# Altium integrated library Weidmueller_OMNIMATE_Signal.IntLib: 2550 symbols (part 12 of 45) (continued)
## 1571140000_Single (continued)
OMNIMATE Signal - series BL/SL 5.00; PartNumber: 1571140000; Manufacturer: Weidmueller; Short_text_for_material: SL 5.00/03/90 3.2SN OR BX; Side_termination_characteristic: open side; Mounting_onto_the_PCB: Solder connection; Pitch_mm: 5 mm; Pitch_inch: 0.197 inch; No_of_poles: 3; Outgoing_elbow: 90°; Solder_pin_length_mm: 3.2 mm; Contact_material: CuSn; Contact_surface: tinned; Insulating_material: PBT; UL_94_flammability_rating: V-0; Rated_voltage_for_surge_voltage_class_pollution_degree_II_2: 400 V; Rated_current_min_no_of_poles_TU_20_deg_C: 32 A; Rated_voltage_use_group_B_UL_1059: 300 V; Rated_current_use_group_B_UL_1059: 15 A; PackageReference: SL_5_00_90_03; Colour: Orange; Packaging: Box; Qty: 100 PCS; Revision: V1; ComponentLink1Description: Manufacturer URL; ComponentLink1URL: http://www.weidmueller.com/; ComponentLink2Description: URL Link1; ComponentLink2URL: http://catalog.weidmueller.com/catalog/Start.do?localeId=en&ObjectID=1571140000
footprint SL_5_00_90_03 (OMNIMATE Signal - Serie BL/SL 5.00  SL 5.00/03/90 3.2)
part A pins: A1
part B pins: A2
part C pins: A3

## 1571150000
designator J?
OMNIMATE Signal - series BL/SL 5.00; PartNumber: 1571150000; Manufacturer: Weidmueller; Short_text_for_material: SL 5.00/04/90 3.2SN OR BX; Side_termination_characteristic: open side; Mounting_onto_the_PCB: Solder connection; Pitch_mm: 5 mm; Pitch_inch: 0.197 inch; No_of_poles: 4; Outgoing_elbow: 90°; Solder_pin_length_mm: 3.2 mm; Contact_material: CuSn; Contact_surface: tinned; Insulating_material: PBT; UL_94_flammability_rating: V-0; Rated_voltage_for_surge_voltage_class_pollution_degree_II_2: 400 V; Rated_current_min_no_of_poles_TU_20_deg_C: 32 A; Rated_voltage_use_group_B_UL_1059: 300 V; Rated_current_use_group_B_UL_1059: 15 A; PackageReference: SL_5_00_90_04; Colour: Orange; Packaging: Box; Qty: 100 PCS; Revision: V1; ComponentLink1Description: Manufacturer URL; ComponentLink1URL: http://www.weidmueller.com/; ComponentLink2Description: URL Link1; ComponentLink2URL: http://catalog.weidmueller.com/catalog/Start.do?localeId=en&ObjectID=1571150000
footprint SL_5_00_90_04 (OMNIMATE Signal - Serie BL/SL 5.00  SL 5.00/04/90 3.2)
pins: A1, A2, A3, A4

## 1571150000_Single
designator J?
OMNIMATE Signal - series BL/SL 5.00; PartNumber: 1571150000; Manufacturer: Weidmueller; Short_text_for_material: SL 5.00/04/90 3.2SN OR BX; Side_termination_characteristic: open side; Mounting_onto_the_PCB: Solder connection; Pitch_mm: 5 mm; Pitch_inch: 0.197 inch; No_of_poles: 4; Outgoing_elbow: 90°; Solder_pin_length_mm: 3.2 mm; Contact_material: CuSn; Contact_surface: tinned; Insulating_material: PBT; UL_94_flammability_rating: V-0; Rated_voltage_for_surge_voltage_class_pollution_degree_II_2: 400 V; Rated_current_min_no_of_poles_TU_20_deg_C: 32 A; Rated_voltage_use_group_B_UL_1059: 300 V; Rated_current_use_group_B_UL_1059: 15 A; PackageReference: SL_5_00_90_04; Colour: Orange; Packaging: Box; Qty: 100 PCS; Revision: V1; ComponentLink1Description: Manufacturer URL; ComponentLink1URL: http://www.weidmueller.com/; ComponentLink2Description: URL Link1; ComponentLink2URL: http://catalog.weidmueller.com/catalog/Start.do?localeId=en&ObjectID=1571150000
footprint SL_5_00_90_04 (OMNIMATE Signal - Serie BL/SL 5.00  SL 5.00/04/90 3.2)
part A pins: A1
part B pins: A2
part C pins: A3
part D pins: A4

## 1571190000
designator J?
OMNIMATE Signal - series BL/SL 5.00; PartNumber: 1571190000; Manufacturer: Weidmueller; Short_text_for_material: SL 5.00/08/90 3.2SN OR BX; Side_termination_characteristic: open side; Mounting_onto_the_PCB: Solder connection; Pitch_mm: 5 mm; Pitch_inch: 0.197 inch; No_of_poles: 8; Outgoing_elbow: 90°; Solder_pin_length_mm: 3.2 mm; Contact_material: CuSn; Contact_surface: tinned; Insulating_material: PBT; UL_94_flammability_rating: V-0; Rated_voltage_for_surge_voltage_class_pollution_degree_II_2: 400 V; Rated_current_min_no_of_poles_TU_20_deg_C: 32 A; Rated_voltage_use_group_B_UL_1059: 300 V; Rated_current_use_group_B_UL_1059: 15 A; PackageReference: SL_5_00_90_08; Colour: Orange; Packaging: Box; Qty: 50 PCS; Revision: V1; ComponentLink1Description: Manufacturer URL; ComponentLink1URL: http://www.weidmueller.com/; ComponentLink2Description: URL Link1; ComponentLink2URL: http://catalog.weidmueller.com/catalog/Start.do?localeId=en&ObjectID=1571190000
footprint SL_5_00_90_08 (OMNIMATE Signal - Serie BL/SL 5.00  SL 5.00/08/90 3.2)
pins: A1, A2, A3, A4, A5, A6, A7, A8

## 1571190000_Single
designator J?
OMNIMATE Signal - series BL/SL 5.00; PartNumber: 1571190000; Manufacturer: Weidmueller; Short_text_for_material: SL 5.00/08/90 3.2SN OR BX; Side_termination_characteristic: open side; Mounting_onto_the_PCB: Solder connection; Pitch_mm: 5 mm; Pitch_inch: 0.197 inch; No_of_poles: 8; Outgoing_elbow: 90°; Solder_pin_length_mm: 3.2 mm; Contact_material: CuSn; Contact_surface: tinned; Insulating_material: PBT; UL_94_flammability_rating: V-0; Rated_voltage_for_surge_voltage_class_pollution_degree_II_2: 400 V; Rated_current_min_no_of_poles_TU_20_deg_C: 32 A; Rated_voltage_use_group_B_UL_1059: 300 V; Rated_current_use_group_B_UL_1059: 15 A; PackageReference: SL_5_00_90_08; Colour: Orange; Packaging: Box; Qty: 50 PCS; Revision: V1; ComponentLink1Description: Manufacturer URL; ComponentLink1URL: http://www.weidmueller.com/; ComponentLink2Description: URL Link1; ComponentLink2URL: http://catalog.weidmueller.com/catalog/Start.do?localeId=en&ObjectID=1571190000
footprint SL_5_00_90_08 (OMNIMATE Signal - Serie BL/SL 5.00  SL 5.00/08/90 3.2)
part A pins: A1
part B pins: A2
part C pins: A3
part D pins: A4
part E pins: A5
part F pins: A6
part G pins: A7
part H pins: A8

## 1580860000
designator J?
OMNIMATE Signal - series BL/SL 5.00; PartNumber: 1580860000; Manufacturer: Weidmueller; Short_text_for_material: SL 5.00/02/90B 3.2SN OR BX; Side_termination_characteristic: Dovetails for fixing blocks; Mounting_onto_the_PCB: Solder connection; Pitch_mm: 5 mm; Pitch_inch: 0.197 inch; No_of_poles: 2; Outgoing_elbow: 90°; Solder_pin_length_mm: 3.2 mm; Contact_material: CuSn; Contact_surface: tinned; Insulating_material: PBT; UL_94_flammability_rating: V-0; Rated_voltage_for_surge_voltage_class_pollution_degree_II_2: 400 V; Rated_current_min_no_of_poles_TU_20_deg_C: 32 A; Rated_voltage_use_group_B_UL_1059: 300 V; Rated_current_use_group_B_UL_1059: 15 A; PackageReference: SL_5_00_90B_02; Colour: Orange; Packaging: Box; Qty: 100 PCS; Revision: V1; ComponentLink1Description: Manufacturer URL; ComponentLink1URL: http://www.weidmueller.com/; ComponentLink2Description: URL Link1; ComponentLink2URL: http://catalog.weidmueller.com/catalog/Start.do?localeId=en&ObjectID=1580860000
footprint SL_5_00_90B_02 (OMNIMATE Signal - Serie BL/SL 5.00  SL 5.00/02/90B 3.2)
pins: A1, A2

## 1580860000_Single
designator J?
OMNIMATE Signal - series BL/SL 5.00; PartNumber: 1580860000; Manufacturer: Weidmueller; Short_text_for_material: SL 5.00/02/90B 3.2SN OR BX; Side_termination_characteristic: Dovetails for fixing blocks; Mounting_onto_the_PCB: Solder connection; Pitch_mm: 5 mm; Pitch_inch: 0.197 inch; No_of_poles: 2; Outgoing_elbow: 90°; Solder_pin_length_mm: 3.2 mm; Contact_material: CuSn; Contact_surface: tinned; Insulating_material: PBT; UL_94_flammability_rating: V-0; Rated_voltage_for_surge_voltage_class_pollution_degree_II_2: 400 V; Rated_current_min_no_of_poles_TU_20_deg_C: 32 A; Rated_voltage_use_group_B_UL_1059: 300 V; Rated_current_use_group_B_UL_1059: 15 A; PackageReference: SL_5_00_90B_02; Colour: Orange; Packaging: Box; Qty: 100 PCS; Revision: V1; ComponentLink1Description: Manufacturer URL; ComponentLink1URL: http://www.weidmueller.com/; ComponentLink2Description: URL Link1; ComponentLink2URL: http://catalog.weidmueller.com/catalog/Start.do?localeId=en&ObjectID=1580860000
footprint SL_5_00_90B_02 (OMNIMATE Signal - Serie BL/SL 5.00  SL 5.00/02/90B 3.2)
part A pins: A1
part B pins: A2

## 1580870000
designator J?
OMNIMATE Signal - series BL/SL 5.00; PartNumber: 1580870000; Manufacturer: Weidmueller; Short_text_for_material: SL 5.00/03/90B 3.2SN OR BX; Side_termination_characteristic: Dovetails for fixing blocks; Mounting_onto_the_PCB: Solder connection; Pitch_mm: 5 mm; Pitch_inch: 0.197 inch; No_of_poles: 3; Outgoing_elbow: 90°; Solder_pin_length_mm: 3.2 mm; Contact_material: CuSn; Contact_surface: tinned; Insulating_material: PBT; UL_94_flammability_rating: V-0; Rated_voltage_for_surge_voltage_class_pollution_degree_II_2: 400 V; Rated_current_min_no_of_poles_TU_20_deg_C: 32 A; Rated_voltage_use_group_B_UL_1059: 300 V; Rated_current_use_group_B_UL_1059: 15 A; PackageReference: SL_5_00_90B_03; Colour: Orange; Packaging: Box; Qty: 100 PCS; Revision: V1; ComponentLink1Description: Manufacturer URL; ComponentLink1URL: http://www.weidmueller.com/; ComponentLink2Description: URL Link1; ComponentLink2URL: http://catalog.weidmueller.com/catalog/Start.do?localeId=en&ObjectID=1580870000
footprint SL_5_00_90B_03 (OMNIMATE Signal - Serie BL/SL 5.00  SL 5.00/03/90B 3.2)
pins: A1, A2, A3

## 1580870000_Single
designator J?
OMNIMATE Signal - series BL/SL 5.00; PartNumber: 1580870000; Manufacturer: Weidmueller; Short_text_for_material: SL 5.00/03/90B 3.2SN OR BX; Side_termination_characteristic: Dovetails for fixing blocks; Mounting_onto_the_PCB: Solder connection; Pitch_mm: 5 mm; Pitch_inch: 0.197 inch; No_of_poles: 3; Outgoing_elbow: 90°; Solder_pin_length_mm: 3.2 mm; Contact_material: CuSn; Contact_surface: tinned; Insulating_material: PBT; UL_94_flammability_rating: V-0; Rated_voltage_for_surge_voltage_class_pollution_degree_II_2: 400 V; Rated_current_min_no_of_poles_TU_20_deg_C: 32 A; Rated_voltage_use_group_B_UL_1059: 300 V; Rated_current_use_group_B_UL_1059: 15 A; PackageReference: SL_5_00_90B_03; Colour: Orange; Packaging: Box; Qty: 100 PCS; Revision: V1; ComponentLink1Description: Manufacturer URL; ComponentLink1URL: http://www.weidmueller.com/; ComponentLink2Description: URL Link1; ComponentLink2URL: http://catalog.weidmueller.com/catalog/Start.do?localeId=en&ObjectID=1580870000
footprint SL_5_00_90B_03 (OMNIMATE Signal - Serie BL/SL 5.00  SL 5.00/03/90B 3.2)
part A pins: A1
part B pins: A2
part C pins: A3

## 1580880000
designator J?
OMNIMATE Signal - series BL/SL 5.00; PartNumber: 1580880000; Manufacturer: Weidmueller; Short_text_for_material: SL 5.00/04/90B 3.2SN OR BX; Side_termination_characteristic: Dovetails for fixing blocks; Mounting_onto_the_PCB: Solder connection; Pitch_mm: 5 mm; Pitch_inch: 0.197 inch; No_of_poles: 4; Outgoing_elbow: 90°; Solder_pin_length_mm: 3.2 mm; Contact_material: CuSn; Contact_surface: tinned; Insulating_material: PBT; UL_94_flammability_rating: V-0; Rated_voltage_for_surge_voltage_class_pollution_degree_II_2: 400 V; Rated_current_min_no_of_poles_TU_20_deg_C: 32 A; Rated_voltage_use_group_B_UL_1059: 300 V; Rated_current_use_group_B_UL_1059: 15 A; PackageReference: SL_5_00_90B_04; Colour: Orange; Packaging: Box; Qty: 100 PCS; Revision: V1; ComponentLink1Description: Manufacturer URL; ComponentLink1URL: http://www.weidmueller.com/; ComponentLink2Description: URL Link1; ComponentLink2URL: http://catalog.weidmueller.com/catalog/Start.do?localeId=en&ObjectID=1580880000
footprint SL_5_00_90B_04 (OMNIMATE Signal - Serie BL/SL 5.00  SL 5.00/04/90B 3.2)
pins: A1, A2, A3, A4

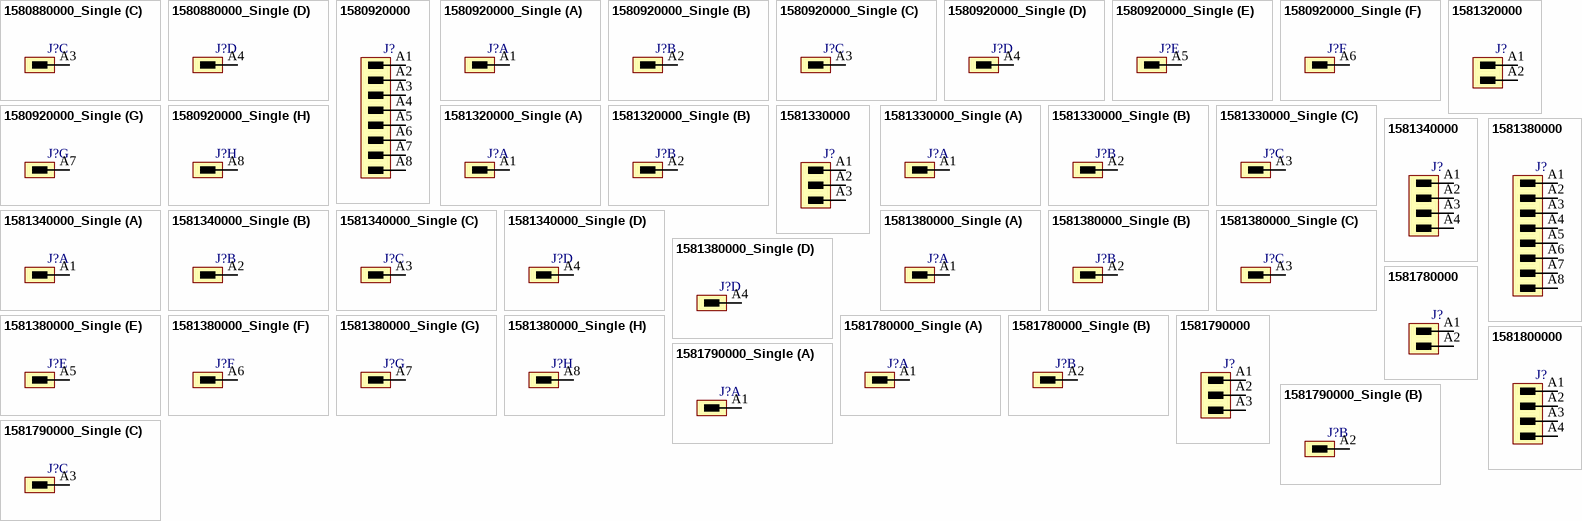
[diagram p72: symbols 1580880000_Single to 1581800000]

## 1580880000_Single
designator J?
OMNIMATE Signal - series BL/SL 5.00; PartNumber: 1580880000; Manufacturer: Weidmueller; Short_text_for_material: SL 5.00/04/90B 3.2SN OR BX; Side_termination_characteristic: Dovetails for fixing blocks; Mounting_onto_the_PCB: Solder connection; Pitch_mm: 5 mm; Pitch_inch: 0.197 inch; No_of_poles: 4; Outgoing_elbow: 90°; Solder_pin_length_mm: 3.2 mm; Contact_material: CuSn; Contact_surface: tinned; Insulating_material: PBT; UL_94_flammability_rating: V-0; Rated_voltage_for_surge_voltage_class_pollution_degree_II_2: 400 V; Rated_current_min_no_of_poles_TU_20_deg_C: 32 A; Rated_voltage_use_group_B_UL_1059: 300 V; Rated_current_use_group_B_UL_1059: 15 A; PackageReference: SL_5_00_90B_04; Colour: Orange; Packaging: Box; Qty: 100 PCS; Revision: V1; ComponentLink1Description: Manufacturer URL; ComponentLink1URL: http://www.weidmueller.com/; ComponentLink2Description: URL Link1; ComponentLink2URL: http://catalog.weidmueller.com/catalog/Start.do?localeId=en&ObjectID=1580880000
footprint SL_5_00_90B_04 (OMNIMATE Signal - Serie BL/SL 5.00  SL 5.00/04/90B 3.2)
part A pins: A1
part B pins: A2
part C pins: A3
part D pins: A4

## 1580920000
designator J?
OMNIMATE Signal - series BL/SL 5.00; PartNumber: 1580920000; Manufacturer: Weidmueller; Short_text_for_material: SL 5.00/08/90B 3.2SN OR BX; Side_termination_characteristic: Dovetails for fixing blocks; Mounting_onto_the_PCB: Solder connection; Pitch_mm: 5 mm; Pitch_inch: 0.197 inch; No_of_poles: 8; Outgoing_elbow: 90°; Solder_pin_length_mm: 3.2 mm; Contact_material: CuSn; Contact_surface: tinned; Insulating_material: PBT; UL_94_flammability_rating: V-0; Rated_voltage_for_surge_voltage_class_pollution_degree_II_2: 400 V; Rated_current_min_no_of_poles_TU_20_deg_C: 32 A; Rated_voltage_use_group_B_UL_1059: 300 V; Rated_current_use_group_B_UL_1059: 15 A; PackageReference: SL_5_00_90B_08; Colour: Orange; Packaging: Box; Qty: 50 PCS; Revision: V1; ComponentLink1Description: Manufacturer URL; ComponentLink1URL: http://www.weidmueller.com/; ComponentLink2Description: URL Link1; ComponentLink2URL: http://catalog.weidmueller.com/catalog/Start.do?localeId=en&ObjectID=1580920000
footprint SL_5_00_90B_08 (OMNIMATE Signal - Serie BL/SL 5.00  SL 5.00/08/90B 3.2)
pins: A1, A2, A3, A4, A5, A6, A7, A8

## 1580920000_Single
designator J?
OMNIMATE Signal - series BL/SL 5.00; PartNumber: 1580920000; Manufacturer: Weidmueller; Short_text_for_material: SL 5.00/08/90B 3.2SN OR BX; Side_termination_characteristic: Dovetails for fixing blocks; Mounting_onto_the_PCB: Solder connection; Pitch_mm: 5 mm; Pitch_inch: 0.197 inch; No_of_poles: 8; Outgoing_elbow: 90°; Solder_pin_length_mm: 3.2 mm; Contact_material: CuSn; Contact_surface: tinned; Insulating_material: PBT; UL_94_flammability_rating: V-0; Rated_voltage_for_surge_voltage_class_pollution_degree_II_2: 400 V; Rated_current_min_no_of_poles_TU_20_deg_C: 32 A; Rated_voltage_use_group_B_UL_1059: 300 V; Rated_current_use_group_B_UL_1059: 15 A; PackageReference: SL_5_00_90B_08; Colour: Orange; Packaging: Box; Qty: 50 PCS; Revision: V1; ComponentLink1Description: Manufacturer URL; ComponentLink1URL: http://www.weidmueller.com/; ComponentLink2Description: URL Link1; ComponentLink2URL: http://catalog.weidmueller.com/catalog/Start.do?localeId=en&ObjectID=1580920000
footprint SL_5_00_90B_08 (OMNIMATE Signal - Serie BL/SL 5.00  SL 5.00/08/90B 3.2)
part A pins: A1
part B pins: A2
part C pins: A3
part D pins: A4
part E pins: A5
part F pins: A6
part G pins: A7
part H pins: A8

## 1581320000
designator J?
OMNIMATE Signal - series BL/SL 5.00; PartNumber: 1581320000; Manufacturer: Weidmueller; Short_text_for_material: SL 5.00/02/180 3.2SN OR BX; Side_termination_characteristic: open side; Mounting_onto_the_PCB: Solder connection; Pitch_mm: 5 mm; Pitch_inch: 0.197 inch; No_of_poles: 2; Outgoing_elbow: 180°; Solder_pin_length_mm: 3.2 mm; Contact_material: CuSn; Contact_surface: tinned; Insulating_material: PBT; UL_94_flammability_rating: V-0; Rated_voltage_for_surge_voltage_class_pollution_degree_II_2: 400 V; Rated_current_min_no_of_poles_TU_20_deg_C: 32 A; Rated_voltage_use_group_B_UL_1059: 300 V; Rated_current_use_group_B_UL_1059: 15 A; PackageReference: SL_5_00_180_02; Colour: Orange; Packaging: Box; Qty: 100 PCS; Revision: V1; ComponentLink1Description: Manufacturer URL; ComponentLink1URL: http://www.weidmueller.com/; ComponentLink2Description: URL Link1; ComponentLink2URL: http://catalog.weidmueller.com/catalog/Start.do?localeId=en&ObjectID=1581320000
footprint SL_5_00_180_02 (OMNIMATE Signal - Serie BL/SL 5.00  SL 5.00/02/180 3.2)
pins: A1, A2

## 1581320000_Single
designator J?
OMNIMATE Signal - series BL/SL 5.00; PartNumber: 1581320000; Manufacturer: Weidmueller; Short_text_for_material: SL 5.00/02/180 3.2SN OR BX; Side_termination_characteristic: open side; Mounting_onto_the_PCB: Solder connection; Pitch_mm: 5 mm; Pitch_inch: 0.197 inch; No_of_poles: 2; Outgoing_elbow: 180°; Solder_pin_length_mm: 3.2 mm; Contact_material: CuSn; Contact_surface: tinned; Insulating_material: PBT; UL_94_flammability_rating: V-0; Rated_voltage_for_surge_voltage_class_pollution_degree_II_2: 400 V; Rated_current_min_no_of_poles_TU_20_deg_C: 32 A; Rated_voltage_use_group_B_UL_1059: 300 V; Rated_current_use_group_B_UL_1059: 15 A; PackageReference: SL_5_00_180_02; Colour: Orange; Packaging: Box; Qty: 100 PCS; Revision: V1; ComponentLink1Description: Manufacturer URL; ComponentLink1URL: http://www.weidmueller.com/; ComponentLink2Description: URL Link1; ComponentLink2URL: http://catalog.weidmueller.com/catalog/Start.do?localeId=en&ObjectID=1581320000
footprint SL_5_00_180_02 (OMNIMATE Signal - Serie BL/SL 5.00  SL 5.00/02/180 3.2)
part A pins: A1
part B pins: A2

## 1581330000
designator J?
OMNIMATE Signal - series BL/SL 5.00; PartNumber: 1581330000; Manufacturer: Weidmueller; Short_text_for_material: SL 5.00/03/180 3.2SN OR BX; Side_termination_characteristic: open side; Mounting_onto_the_PCB: Solder connection; Pitch_mm: 5 mm; Pitch_inch: 0.197 inch; No_of_poles: 3; Outgoing_elbow: 180°; Solder_pin_length_mm: 3.2 mm; Contact_material: CuSn; Contact_surface: tinned; Insulating_material: PBT; UL_94_flammability_rating: V-0; Rated_voltage_for_surge_voltage_class_pollution_degree_II_2: 400 V; Rated_current_min_no_of_poles_TU_20_deg_C: 32 A; Rated_voltage_use_group_B_UL_1059: 300 V; Rated_current_use_group_B_UL_1059: 15 A; PackageReference: SL_5_00_180_03; Colour: Orange; Packaging: Box; Qty: 100 PCS; Revision: V1; ComponentLink1Description: Manufacturer URL; ComponentLink1URL: http://www.weidmueller.com/; ComponentLink2Description: URL Link1; ComponentLink2URL: http://catalog.weidmueller.com/catalog/Start.do?localeId=en&ObjectID=1581330000
footprint SL_5_00_180_03 (OMNIMATE Signal - Serie BL/SL 5.00  SL 5.00/03/180 3.2)
pins: A1, A2, A3

## 1581330000_Single
designator J?
OMNIMATE Signal - series BL/SL 5.00; PartNumber: 1581330000; Manufacturer: Weidmueller; Short_text_for_material: SL 5.00/03/180 3.2SN OR BX; Side_termination_characteristic: open side; Mounting_onto_the_PCB: Solder connection; Pitch_mm: 5 mm; Pitch_inch: 0.197 inch; No_of_poles: 3; Outgoing_elbow: 180°; Solder_pin_length_mm: 3.2 mm; Contact_material: CuSn; Contact_surface: tinned; Insulating_material: PBT; UL_94_flammability_rating: V-0; Rated_voltage_for_surge_voltage_class_pollution_degree_II_2: 400 V; Rated_current_min_no_of_poles_TU_20_deg_C: 32 A; Rated_voltage_use_group_B_UL_1059: 300 V; Rated_current_use_group_B_UL_1059: 15 A; PackageReference: SL_5_00_180_03; Colour: Orange; Packaging: Box; Qty: 100 PCS; Revision: V1; ComponentLink1Description: Manufacturer URL; ComponentLink1URL: http://www.weidmueller.com/; ComponentLink2Description: URL Link1; ComponentLink2URL: http://catalog.weidmueller.com/catalog/Start.do?localeId=en&ObjectID=1581330000
footprint SL_5_00_180_03 (OMNIMATE Signal - Serie BL/SL 5.00  SL 5.00/03/180 3.2)
part A pins: A1
part B pins: A2
part C pins: A3

## 1581340000
designator J?
OMNIMATE Signal - series BL/SL 5.00; PartNumber: 1581340000; Manufacturer: Weidmueller; Short_text_for_material: SL 5.00/04/180 3.2SN OR BX; Side_termination_characteristic: open side; Mounting_onto_the_PCB: Solder connection; Pitch_mm: 5 mm; Pitch_inch: 0.197 inch; No_of_poles: 4; Outgoing_elbow: 180°; Solder_pin_length_mm: 3.2 mm; Contact_material: CuSn; Contact_surface: tinned; Insulating_material: PBT; UL_94_flammability_rating: V-0; Rated_voltage_for_surge_voltage_class_pollution_degree_II_2: 400 V; Rated_current_min_no_of_poles_TU_20_deg_C: 32 A; Rated_voltage_use_group_B_UL_1059: 300 V; Rated_current_use_group_B_UL_1059: 15 A; PackageReference: SL_5_00_180_04; Colour: Orange; Packaging: Box; Qty: 100 PCS; Revision: V1; ComponentLink1Description: Manufacturer URL; ComponentLink1URL: http://www.weidmueller.com/; ComponentLink2Description: URL Link1; ComponentLink2URL: http://catalog.weidmueller.com/catalog/Start.do?localeId=en&ObjectID=1581340000
footprint SL_5_00_180_04 (OMNIMATE Signal - Serie BL/SL 5.00  SL 5.00/04/180 3.2)
pins: A1, A2, A3, A4

## 1581340000_Single
designator J?
OMNIMATE Signal - series BL/SL 5.00; PartNumber: 1581340000; Manufacturer: Weidmueller; Short_text_for_material: SL 5.00/04/180 3.2SN OR BX; Side_termination_characteristic: open side; Mounting_onto_the_PCB: Solder connection; Pitch_mm: 5 mm; Pitch_inch: 0.197 inch; No_of_poles: 4; Outgoing_elbow: 180°; Solder_pin_length_mm: 3.2 mm; Contact_material: CuSn; Contact_surface: tinned; Insulating_material: PBT; UL_94_flammability_rating: V-0; Rated_voltage_for_surge_voltage_class_pollution_degree_II_2: 400 V; Rated_current_min_no_of_poles_TU_20_deg_C: 32 A; Rated_voltage_use_group_B_UL_1059: 300 V; Rated_current_use_group_B_UL_1059: 15 A; PackageReference: SL_5_00_180_04; Colour: Orange; Packaging: Box; Qty: 100 PCS; Revision: V1; ComponentLink1Description: Manufacturer URL; ComponentLink1URL: http://www.weidmueller.com/; ComponentLink2Description: URL Link1; ComponentLink2URL: http://catalog.weidmueller.com/catalog/Start.do?localeId=en&ObjectID=1581340000
footprint SL_5_00_180_04 (OMNIMATE Signal - Serie BL/SL 5.00  SL 5.00/04/180 3.2)
part A pins: A1
part B pins: A2
part C pins: A3
part D pins: A4

## 1581380000
designator J?
OMNIMATE Signal - series BL/SL 5.00; PartNumber: 1581380000; Manufacturer: Weidmueller; Short_text_for_material: SL 5.00/08/180 3.2SN OR BX; Side_termination_characteristic: open side; Mounting_onto_the_PCB: Solder connection; Pitch_mm: 5 mm; Pitch_inch: 0.197 inch; No_of_poles: 8; Outgoing_elbow: 180°; Solder_pin_length_mm: 3.2 mm; Contact_material: CuSn; Contact_surface: tinned; Insulating_material: PBT; UL_94_flammability_rating: V-0; Rated_voltage_for_surge_voltage_class_pollution_degree_II_2: 400 V; Rated_current_min_no_of_poles_TU_20_deg_C: 32 A; Rated_voltage_use_group_B_UL_1059: 300 V; Rated_current_use_group_B_UL_1059: 15 A; PackageReference: SL_5_00_180_08; Colour: Orange; Packaging: Box; Qty: 50 PCS; Revision: V1; ComponentLink1Description: Manufacturer URL; ComponentLink1URL: http://www.weidmueller.com/; ComponentLink2Description: URL Link1; ComponentLink2URL: http://catalog.weidmueller.com/catalog/Start.do?localeId=en&ObjectID=1581380000
footprint SL_5_00_180_08 (OMNIMATE Signal - Serie BL/SL 5.00  SL 5.00/08/180 3.2)
pins: A1, A2, A3, A4, A5, A6, A7, A8

## 1581380000_Single
designator J?
OMNIMATE Signal - series BL/SL 5.00; PartNumber: 1581380000; Manufacturer: Weidmueller; Short_text_for_material: SL 5.00/08/180 3.2SN OR BX; Side_termination_characteristic: open side; Mounting_onto_the_PCB: Solder connection; Pitch_mm: 5 mm; Pitch_inch: 0.197 inch; No_of_poles: 8; Outgoing_elbow: 180°; Solder_pin_length_mm: 3.2 mm; Contact_material: CuSn; Contact_surface: tinned; Insulating_material: PBT; UL_94_flammability_rating: V-0; Rated_voltage_for_surge_voltage_class_pollution_degree_II_2: 400 V; Rated_current_min_no_of_poles_TU_20_deg_C: 32 A; Rated_voltage_use_group_B_UL_1059: 300 V; Rated_current_use_group_B_UL_1059: 15 A; PackageReference: SL_5_00_180_08; Colour: Orange; Packaging: Box; Qty: 50 PCS; Revision: V1; ComponentLink1Description: Manufacturer URL; ComponentLink1URL: http://www.weidmueller.com/; ComponentLink2Description: URL Link1; ComponentLink2URL: http://catalog.weidmueller.com/catalog/Start.do?localeId=en&ObjectID=1581380000
footprint SL_5_00_180_08 (OMNIMATE Signal - Serie BL/SL 5.00  SL 5.00/08/180 3.2)
part A pins: A1
part B pins: A2
part C pins: A3
part D pins: A4
part E pins: A5
part F pins: A6
part G pins: A7
part H pins: A8

## 1581780000
designator J?
OMNIMATE Signal - series BL/SL 5.00; PartNumber: 1581780000; Manufacturer: Weidmueller; Short_text_for_material: SL 5.00/02/180B 3.2SN OR BX; Side_termination_characteristic: Dovetails for fixing blocks; Mounting_onto_the_PCB: Solder connection; Pitch_mm: 5 mm; Pitch_inch: 0.197 inch; No_of_poles: 2; Outgoing_elbow: 180°; Solder_pin_length_mm: 3.2 mm; Contact_material: CuSn; Contact_surface: tinned; Insulating_material: PBT; UL_94_flammability_rating: V-0; Rated_voltage_for_surge_voltage_class_pollution_degree_II_2: 400 V; Rated_current_min_no_of_poles_TU_20_deg_C: 32 A; Rated_voltage_use_group_B_UL_1059: 300 V; Rated_current_use_group_B_UL_1059: 15 A; PackageReference: SL_5_00_180B_02; Colour: Orange; Packaging: Box; Qty: 100 PCS; Revision: V1; ComponentLink1Description: Manufacturer URL; ComponentLink1URL: http://www.weidmueller.com/; ComponentLink2Description: URL Link1; ComponentLink2URL: http://catalog.weidmueller.com/catalog/Start.do?localeId=en&ObjectID=1581780000
footprint SL_5_00_180B_02 (OMNIMATE Signal - Serie BL/SL 5.00  SL 5.00/02/180B 3.2)
pins: A1, A2

## 1581780000_Single
designator J?
OMNIMATE Signal - series BL/SL 5.00; PartNumber: 1581780000; Manufacturer: Weidmueller; Short_text_for_material: SL 5.00/02/180B 3.2SN OR BX; Side_termination_characteristic: Dovetails for fixing blocks; Mounting_onto_the_PCB: Solder connection; Pitch_mm: 5 mm; Pitch_inch: 0.197 inch; No_of_poles: 2; Outgoing_elbow: 180°; Solder_pin_length_mm: 3.2 mm; Contact_material: CuSn; Contact_surface: tinned; Insulating_material: PBT; UL_94_flammability_rating: V-0; Rated_voltage_for_surge_voltage_class_pollution_degree_II_2: 400 V; Rated_current_min_no_of_poles_TU_20_deg_C: 32 A; Rated_voltage_use_group_B_UL_1059: 300 V; Rated_current_use_group_B_UL_1059: 15 A; PackageReference: SL_5_00_180B_02; Colour: Orange; Packaging: Box; Qty: 100 PCS; Revision: V1; ComponentLink1Description: Manufacturer URL; ComponentLink1URL: http://www.weidmueller.com/; ComponentLink2Description: URL Link1; ComponentLink2URL: http://catalog.weidmueller.com/catalog/Start.do?localeId=en&ObjectID=1581780000
footprint SL_5_00_180B_02 (OMNIMATE Signal - Serie BL/SL 5.00  SL 5.00/02/180B 3.2)
part A pins: A1
part B pins: A2

## 1581790000
designator J?
OMNIMATE Signal - series BL/SL 5.00; PartNumber: 1581790000; Manufacturer: Weidmueller; Short_text_for_material: SL 5.00/03/180B 3.2SN OR BX; Side_termination_characteristic: Dovetails for fixing blocks; Mounting_onto_the_PCB: Solder connection; Pitch_mm: 5 mm; Pitch_inch: 0.197 inch; No_of_poles: 3; Outgoing_elbow: 180°; Solder_pin_length_mm: 3.2 mm; Contact_material: CuSn; Contact_surface: tinned; Insulating_material: PBT; UL_94_flammability_rating: V-0; Rated_voltage_for_surge_voltage_class_pollution_degree_II_2: 400 V; Rated_current_min_no_of_poles_TU_20_deg_C: 32 A; Rated_voltage_use_group_B_UL_1059: 300 V; Rated_current_use_group_B_UL_1059: 15 A; PackageReference: SL_5_00_180B_03; Colour: Orange; Packaging: Box; Qty: 100 PCS; Revision: V1; ComponentLink1Description: Manufacturer URL; ComponentLink1URL: http://www.weidmueller.com/; ComponentLink2Description: URL Link1; ComponentLink2URL: http://catalog.weidmueller.com/catalog/Start.do?localeId=en&ObjectID=1581790000
footprint SL_5_00_180B_03 (OMNIMATE Signal - Serie BL/SL 5.00  SL 5.00/03/180B 3.2)
pins: A1, A2, A3

## 1581790000_Single
designator J?
OMNIMATE Signal - series BL/SL 5.00; PartNumber: 1581790000; Manufacturer: Weidmueller; Short_text_for_material: SL 5.00/03/180B 3.2SN OR BX; Side_termination_characteristic: Dovetails for fixing blocks; Mounting_onto_the_PCB: Solder connection; Pitch_mm: 5 mm; Pitch_inch: 0.197 inch; No_of_poles: 3; Outgoing_elbow: 180°; Solder_pin_length_mm: 3.2 mm; Contact_material: CuSn; Contact_surface: tinned; Insulating_material: PBT; UL_94_flammability_rating: V-0; Rated_voltage_for_surge_voltage_class_pollution_degree_II_2: 400 V; Rated_current_min_no_of_poles_TU_20_deg_C: 32 A; Rated_voltage_use_group_B_UL_1059: 300 V; Rated_current_use_group_B_UL_1059: 15 A; PackageReference: SL_5_00_180B_03; Colour: Orange; Packaging: Box; Qty: 100 PCS; Revision: V1; ComponentLink1Description: Manufacturer URL; ComponentLink1URL: http://www.weidmueller.com/; ComponentLink2Description: URL Link1; ComponentLink2URL: http://catalog.weidmueller.com/catalog/Start.do?localeId=en&ObjectID=1581790000
footprint SL_5_00_180B_03 (OMNIMATE Signal - Serie BL/SL 5.00  SL 5.00/03/180B 3.2)
part A pins: A1
part B pins: A2
part C pins: A3

## 1581800000
designator J?
OMNIMATE Signal - series BL/SL 5.00; PartNumber: 1581800000; Manufacturer: Weidmueller; Short_text_for_material: SL 5.00/04/180B 3.2SN OR BX; Side_termination_characteristic: Dovetails for fixing blocks; Mounting_onto_the_PCB: Solder connection; Pitch_mm: 5 mm; Pitch_inch: 0.197 inch; No_of_poles: 4; Outgoing_elbow: 180°; Solder_pin_length_mm: 3.2 mm; Contact_material: CuSn; Contact_surface: tinned; Insulating_material: PBT; UL_94_flammability_rating: V-0; Rated_voltage_for_surge_voltage_class_pollution_degree_II_2: 400 V; Rated_current_min_no_of_poles_TU_20_deg_C: 32 A; Rated_voltage_use_group_B_UL_1059: 300 V; Rated_current_use_group_B_UL_1059: 15 A; PackageReference: SL_5_00_180B_04; Colour: Orange; Packaging: Box; Qty: 100 PCS; Revision: V1; ComponentLink1Description: Manufacturer URL; ComponentLink1URL: http://www.weidmueller.com/; ComponentLink2Description: URL Link1; ComponentLink2URL: http://catalog.weidmueller.com/catalog/Start.do?localeId=en&ObjectID=1581800000
footprint SL_5_00_180B_04 (OMNIMATE Signal - Serie BL/SL 5.00  SL 5.00/04/180B 3.2)
pins: A1, A2, A3, A4

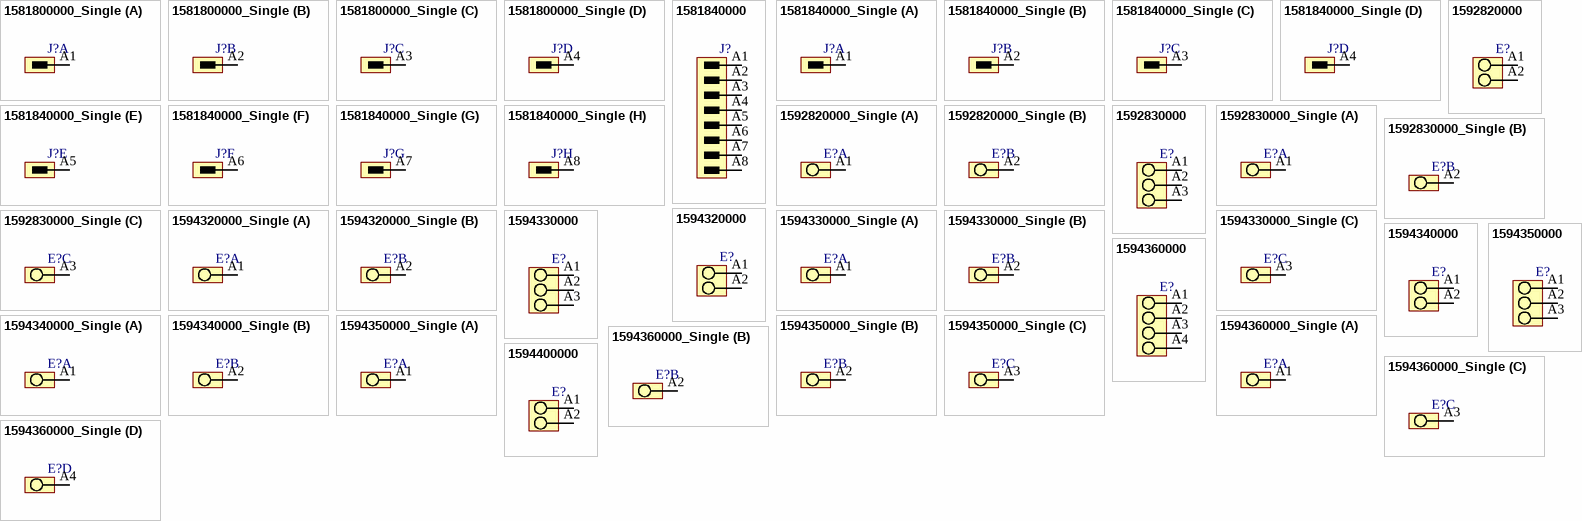
[diagram p73: symbols 1581800000_Single to 1594400000]

## 1581800000_Single
designator J?
OMNIMATE Signal - series BL/SL 5.00; PartNumber: 1581800000; Manufacturer: Weidmueller; Short_text_for_material: SL 5.00/04/180B 3.2SN OR BX; Side_termination_characteristic: Dovetails for fixing blocks; Mounting_onto_the_PCB: Solder connection; Pitch_mm: 5 mm; Pitch_inch: 0.197 inch; No_of_poles: 4; Outgoing_elbow: 180°; Solder_pin_length_mm: 3.2 mm; Contact_material: CuSn; Contact_surface: tinned; Insulating_material: PBT; UL_94_flammability_rating: V-0; Rated_voltage_for_surge_voltage_class_pollution_degree_II_2: 400 V; Rated_current_min_no_of_poles_TU_20_deg_C: 32 A; Rated_voltage_use_group_B_UL_1059: 300 V; Rated_current_use_group_B_UL_1059: 15 A; PackageReference: SL_5_00_180B_04; Colour: Orange; Packaging: Box; Qty: 100 PCS; Revision: V1; ComponentLink1Description: Manufacturer URL; ComponentLink1URL: http://www.weidmueller.com/; ComponentLink2Description: URL Link1; ComponentLink2URL: http://catalog.weidmueller.com/catalog/Start.do?localeId=en&ObjectID=1581800000
footprint SL_5_00_180B_04 (OMNIMATE Signal - Serie BL/SL 5.00  SL 5.00/04/180B 3.2)
part A pins: A1
part B pins: A2
part C pins: A3
part D pins: A4

## 1581840000
designator J?
OMNIMATE Signal - series BL/SL 5.00; PartNumber: 1581840000; Manufacturer: Weidmueller; Short_text_for_material: SL 5.00/08/180B 3.2SN OR BX; Side_termination_characteristic: Dovetails for fixing blocks; Mounting_onto_the_PCB: Solder connection; Pitch_mm: 5 mm; Pitch_inch: 0.197 inch; No_of_poles: 8; Outgoing_elbow: 180°; Solder_pin_length_mm: 3.2 mm; Contact_material: CuSn; Contact_surface: tinned; Insulating_material: PBT; UL_94_flammability_rating: V-0; Rated_voltage_for_surge_voltage_class_pollution_degree_II_2: 400 V; Rated_current_min_no_of_poles_TU_20_deg_C: 32 A; Rated_voltage_use_group_B_UL_1059: 300 V; Rated_current_use_group_B_UL_1059: 15 A; PackageReference: SL_5_00_180B_08; Colour: Orange; Packaging: Box; Qty: 50 PCS; Revision: V1; ComponentLink1Description: Manufacturer URL; ComponentLink1URL: http://www.weidmueller.com/; ComponentLink2Description: URL Link1; ComponentLink2URL: http://catalog.weidmueller.com/catalog/Start.do?localeId=en&ObjectID=1581840000
footprint SL_5_00_180B_08 (OMNIMATE Signal - Serie BL/SL 5.00  SL 5.00/08/180B 3.2)
pins: A1, A2, A3, A4, A5, A6, A7, A8

## 1581840000_Single
designator J?
OMNIMATE Signal - series BL/SL 5.00; PartNumber: 1581840000; Manufacturer: Weidmueller; Short_text_for_material: SL 5.00/08/180B 3.2SN OR BX; Side_termination_characteristic: Dovetails for fixing blocks; Mounting_onto_the_PCB: Solder connection; Pitch_mm: 5 mm; Pitch_inch: 0.197 inch; No_of_poles: 8; Outgoing_elbow: 180°; Solder_pin_length_mm: 3.2 mm; Contact_material: CuSn; Contact_surface: tinned; Insulating_material: PBT; UL_94_flammability_rating: V-0; Rated_voltage_for_surge_voltage_class_pollution_degree_II_2: 400 V; Rated_current_min_no_of_poles_TU_20_deg_C: 32 A; Rated_voltage_use_group_B_UL_1059: 300 V; Rated_current_use_group_B_UL_1059: 15 A; PackageReference: SL_5_00_180B_08; Colour: Orange; Packaging: Box; Qty: 50 PCS; Revision: V1; ComponentLink1Description: Manufacturer URL; ComponentLink1URL: http://www.weidmueller.com/; ComponentLink2Description: URL Link1; ComponentLink2URL: http://catalog.weidmueller.com/catalog/Start.do?localeId=en&ObjectID=1581840000
footprint SL_5_00_180B_08 (OMNIMATE Signal - Serie BL/SL 5.00  SL 5.00/08/180B 3.2)
part A pins: A1
part B pins: A2
part C pins: A3
part D pins: A4
part E pins: A5
part F pins: A6
part G pins: A7
part H pins: A8

## 1592820000
designator E?
OMNIMATE Signal - series LP; PartNumber: 1592820000; Manufacturer: Weidmueller; Short_text_for_material: LP 5.08/02/90 3.2SN OR BX; Side_termination_characteristic: closed side; Mounting_onto_the_PCB: Solder connection; Pitch_mm: 5,08 mm; Pitch_inch: 0,2 inch; No_of_poles: 2; Solder_pin_length_mm: 3,2 mm; Contact_material: Cu-Leg; Contact_surface: tinned; Insulating_material: PA; UL_94_flammability_rating: V-2; Rated_voltage_for_surge_voltage_class_pollution_degree_II_2: 500 V; Rated_current_min_no_of_poles_TU_20_deg_C: 32 A; Solid_min_H05_07_V_U: 0,5 mm²; Solid_max_H05_07_V_U: 6 mm²; Rated_voltage_use_group_B_UL_1059: 300 V; Rated_current_use_group_B_UL_1059: 20 A; Wire_cross_section_AWG_min_UL_1059: AWG 26; Wire_cross_section_AWG_max_UL_1059: AWG 12; PackageReference: LP_5_08_90_02; Colour: Orange; Packaging: Box; Qty: 100 PCS; Revision: V1; ComponentLink1Description: Manufacturer URL; ComponentLink1URL: http://www.weidmueller.com/; ComponentLink2Description: URL Link1; ComponentLink2URL: http://catalog.weidmueller.com/catalog/Start.do?localeId=en&ObjectID=1592820000
footprint LP_5_08_90_02 (OMNIMATE Signal - Serie LP  LP 5.08/02/90 3.2)
pins: A1, A2
1 alternate drawing of the same symbol

## 1592820000_Single
designator E?
OMNIMATE Signal - series LP; PartNumber: 1592820000; Manufacturer: Weidmueller; Short_text_for_material: LP 5.08/02/90 3.2SN OR BX; Side_termination_characteristic: closed side; Mounting_onto_the_PCB: Solder connection; Pitch_mm: 5,08 mm; Pitch_inch: 0,2 inch; No_of_poles: 2; Solder_pin_length_mm: 3,2 mm; Contact_material: Cu-Leg; Contact_surface: tinned; Insulating_material: PA; UL_94_flammability_rating: V-2; Rated_voltage_for_surge_voltage_class_pollution_degree_II_2: 500 V; Rated_current_min_no_of_poles_TU_20_deg_C: 32 A; Solid_min_H05_07_V_U: 0,5 mm²; Solid_max_H05_07_V_U: 6 mm²; Rated_voltage_use_group_B_UL_1059: 300 V; Rated_current_use_group_B_UL_1059: 20 A; Wire_cross_section_AWG_min_UL_1059: AWG 26; Wire_cross_section_AWG_max_UL_1059: AWG 12; PackageReference: LP_5_08_90_02; Colour: Orange; Packaging: Box; Qty: 100 PCS; Revision: V1; ComponentLink1Description: Manufacturer URL; ComponentLink1URL: http://www.weidmueller.com/; ComponentLink2Description: URL Link1; ComponentLink2URL: http://catalog.weidmueller.com/catalog/Start.do?localeId=en&ObjectID=1592820000
footprint LP_5_08_90_02 (OMNIMATE Signal - Serie LP  LP 5.08/02/90 3.2)
part A pins: A1
part B pins: A2
1 alternate drawing of the same symbol

## 1592830000
designator E?
OMNIMATE Signal - series LP; PartNumber: 1592830000; Manufacturer: Weidmueller; Short_text_for_material: LP 5.08/03/90 3.2SN OR BX; Side_termination_characteristic: closed side; Mounting_onto_the_PCB: Solder connection; Pitch_mm: 5,08 mm; Pitch_inch: 0,2 inch; No_of_poles: 3; Solder_pin_length_mm: 3,2 mm; Contact_material: Cu-Leg; Contact_surface: tinned; Insulating_material: PA; UL_94_flammability_rating: V-2; Rated_voltage_for_surge_voltage_class_pollution_degree_II_2: 500 V; Rated_current_min_no_of_poles_TU_20_deg_C: 32 A; Solid_min_H05_07_V_U: 0,5 mm²; Solid_max_H05_07_V_U: 6 mm²; Rated_voltage_use_group_B_UL_1059: 300 V; Rated_current_use_group_B_UL_1059: 20 A; Wire_cross_section_AWG_min_UL_1059: AWG 26; Wire_cross_section_AWG_max_UL_1059: AWG 12; PackageReference: LP_5_08_90_03; Colour: Orange; Packaging: Box; Qty: 100 PCS; Revision: V1; ComponentLink1Description: Manufacturer URL; ComponentLink1URL: http://www.weidmueller.com/; ComponentLink2Description: URL Link1; ComponentLink2URL: http://catalog.weidmueller.com/catalog/Start.do?localeId=en&ObjectID=1592830000
footprint LP_5_08_90_03 (OMNIMATE Signal - Serie LP  LP 5.08/03/90 3.2)
pins: A1, A2, A3
1 alternate drawing of the same symbol

## 1592830000_Single
designator E?
OMNIMATE Signal - series LP; PartNumber: 1592830000; Manufacturer: Weidmueller; Short_text_for_material: LP 5.08/03/90 3.2SN OR BX; Side_termination_characteristic: closed side; Mounting_onto_the_PCB: Solder connection; Pitch_mm: 5,08 mm; Pitch_inch: 0,2 inch; No_of_poles: 3; Solder_pin_length_mm: 3,2 mm; Contact_material: Cu-Leg; Contact_surface: tinned; Insulating_material: PA; UL_94_flammability_rating: V-2; Rated_voltage_for_surge_voltage_class_pollution_degree_II_2: 500 V; Rated_current_min_no_of_poles_TU_20_deg_C: 32 A; Solid_min_H05_07_V_U: 0,5 mm²; Solid_max_H05_07_V_U: 6 mm²; Rated_voltage_use_group_B_UL_1059: 300 V; Rated_current_use_group_B_UL_1059: 20 A; Wire_cross_section_AWG_min_UL_1059: AWG 26; Wire_cross_section_AWG_max_UL_1059: AWG 12; PackageReference: LP_5_08_90_03; Colour: Orange; Packaging: Box; Qty: 100 PCS; Revision: V1; ComponentLink1Description: Manufacturer URL; ComponentLink1URL: http://www.weidmueller.com/; ComponentLink2Description: URL Link1; ComponentLink2URL: http://catalog.weidmueller.com/catalog/Start.do?localeId=en&ObjectID=1592830000
footprint LP_5_08_90_03 (OMNIMATE Signal - Serie LP  LP 5.08/03/90 3.2)
part A pins: A1
part B pins: A2
part C pins: A3
1 alternate drawing of the same symbol

## 1594320000
designator E?
OMNIMATE Signal - series LP; PartNumber: 1594320000; Manufacturer: Weidmueller; Short_text_for_material: LP 5.00/02/90 3.2SN OR BX; Side_termination_characteristic: closed side; Mounting_onto_the_PCB: Solder connection; Pitch_mm: 5 mm; Pitch_inch: 0,197 inch; No_of_poles: 2; Solder_pin_length_mm: 3,2 mm; Contact_material: Cu-Leg; Contact_surface: tinned; Insulating_material: PA; UL_94_flammability_rating: V-2; Rated_voltage_for_surge_voltage_class_pollution_degree_II_2: 500 V; Rated_current_min_no_of_poles_TU_20_deg_C: 32 A; Solid_min_H05_07_V_U: 0,5 mm²; Solid_max_H05_07_V_U: 6 mm²; Rated_voltage_use_group_B_UL_1059: 300 V; Rated_current_use_group_B_UL_1059: 20 A; Wire_cross_section_AWG_min_UL_1059: AWG 26; Wire_cross_section_AWG_max_UL_1059: AWG 12; PackageReference: LP_5_00_90_02; Colour: Orange; Packaging: Box; Qty: 100 PCS; Revision: V1; ComponentLink1Description: Manufacturer URL; ComponentLink1URL: http://www.weidmueller.com/; ComponentLink2Description: URL Link1; ComponentLink2URL: http://catalog.weidmueller.com/catalog/Start.do?localeId=en&ObjectID=1594320000
footprint LP_5_00_90_02 (OMNIMATE Signal - Serie LP  LP 5.00/02/90 3.2)
pins: A1, A2
1 alternate drawing of the same symbol

## 1594320000_Single
designator E?
OMNIMATE Signal - series LP; PartNumber: 1594320000; Manufacturer: Weidmueller; Short_text_for_material: LP 5.00/02/90 3.2SN OR BX; Side_termination_characteristic: closed side; Mounting_onto_the_PCB: Solder connection; Pitch_mm: 5 mm; Pitch_inch: 0,197 inch; No_of_poles: 2; Solder_pin_length_mm: 3,2 mm; Contact_material: Cu-Leg; Contact_surface: tinned; Insulating_material: PA; UL_94_flammability_rating: V-2; Rated_voltage_for_surge_voltage_class_pollution_degree_II_2: 500 V; Rated_current_min_no_of_poles_TU_20_deg_C: 32 A; Solid_min_H05_07_V_U: 0,5 mm²; Solid_max_H05_07_V_U: 6 mm²; Rated_voltage_use_group_B_UL_1059: 300 V; Rated_current_use_group_B_UL_1059: 20 A; Wire_cross_section_AWG_min_UL_1059: AWG 26; Wire_cross_section_AWG_max_UL_1059: AWG 12; PackageReference: LP_5_00_90_02; Colour: Orange; Packaging: Box; Qty: 100 PCS; Revision: V1; ComponentLink1Description: Manufacturer URL; ComponentLink1URL: http://www.weidmueller.com/; ComponentLink2Description: URL Link1; ComponentLink2URL: http://catalog.weidmueller.com/catalog/Start.do?localeId=en&ObjectID=1594320000
footprint LP_5_00_90_02 (OMNIMATE Signal - Serie LP  LP 5.00/02/90 3.2)
part A pins: A1
part B pins: A2
1 alternate drawing of the same symbol

## 1594330000
designator E?
OMNIMATE Signal - series LP; PartNumber: 1594330000; Manufacturer: Weidmueller; Short_text_for_material: LP 5.00/03/90 3.2SN OR BX; Side_termination_characteristic: closed side; Mounting_onto_the_PCB: Solder connection; Pitch_mm: 5 mm; Pitch_inch: 0,197 inch; No_of_poles: 3; Solder_pin_length_mm: 3,2 mm; Contact_material: Cu-Leg; Contact_surface: tinned; Insulating_material: PA; UL_94_flammability_rating: V-2; Rated_voltage_for_surge_voltage_class_pollution_degree_II_2: 500 V; Rated_current_min_no_of_poles_TU_20_deg_C: 32 A; Solid_min_H05_07_V_U: 0,5 mm²; Solid_max_H05_07_V_U: 6 mm²; Rated_voltage_use_group_B_UL_1059: 300 V; Rated_current_use_group_B_UL_1059: 20 A; Wire_cross_section_AWG_min_UL_1059: AWG 26; Wire_cross_section_AWG_max_UL_1059: AWG 12; PackageReference: LP_5_00_90_03; Colour: Orange; Packaging: Box; Qty: 100 PCS; Revision: V1; ComponentLink1Description: Manufacturer URL; ComponentLink1URL: http://www.weidmueller.com/; ComponentLink2Description: URL Link1; ComponentLink2URL: http://catalog.weidmueller.com/catalog/Start.do?localeId=en&ObjectID=1594330000
footprint LP_5_00_90_03 (OMNIMATE Signal - Serie LP  LP 5.00/03/90 3.2)
pins: A1, A2, A3
1 alternate drawing of the same symbol